# Altium footprint library Electronic Devices_LIB.PcbLib: 410 footprints (part 4 of 26)
Each footprint in its own frame and in the unit in brackets; x right, y up, seen from the top. Pads: shape width x height; smd on the part's side, far side on the other; paste and mask are expansions set on the pad; w line width, h text height; cw(c..) or ccw(c..) is an arc to the next point about the centre after c.
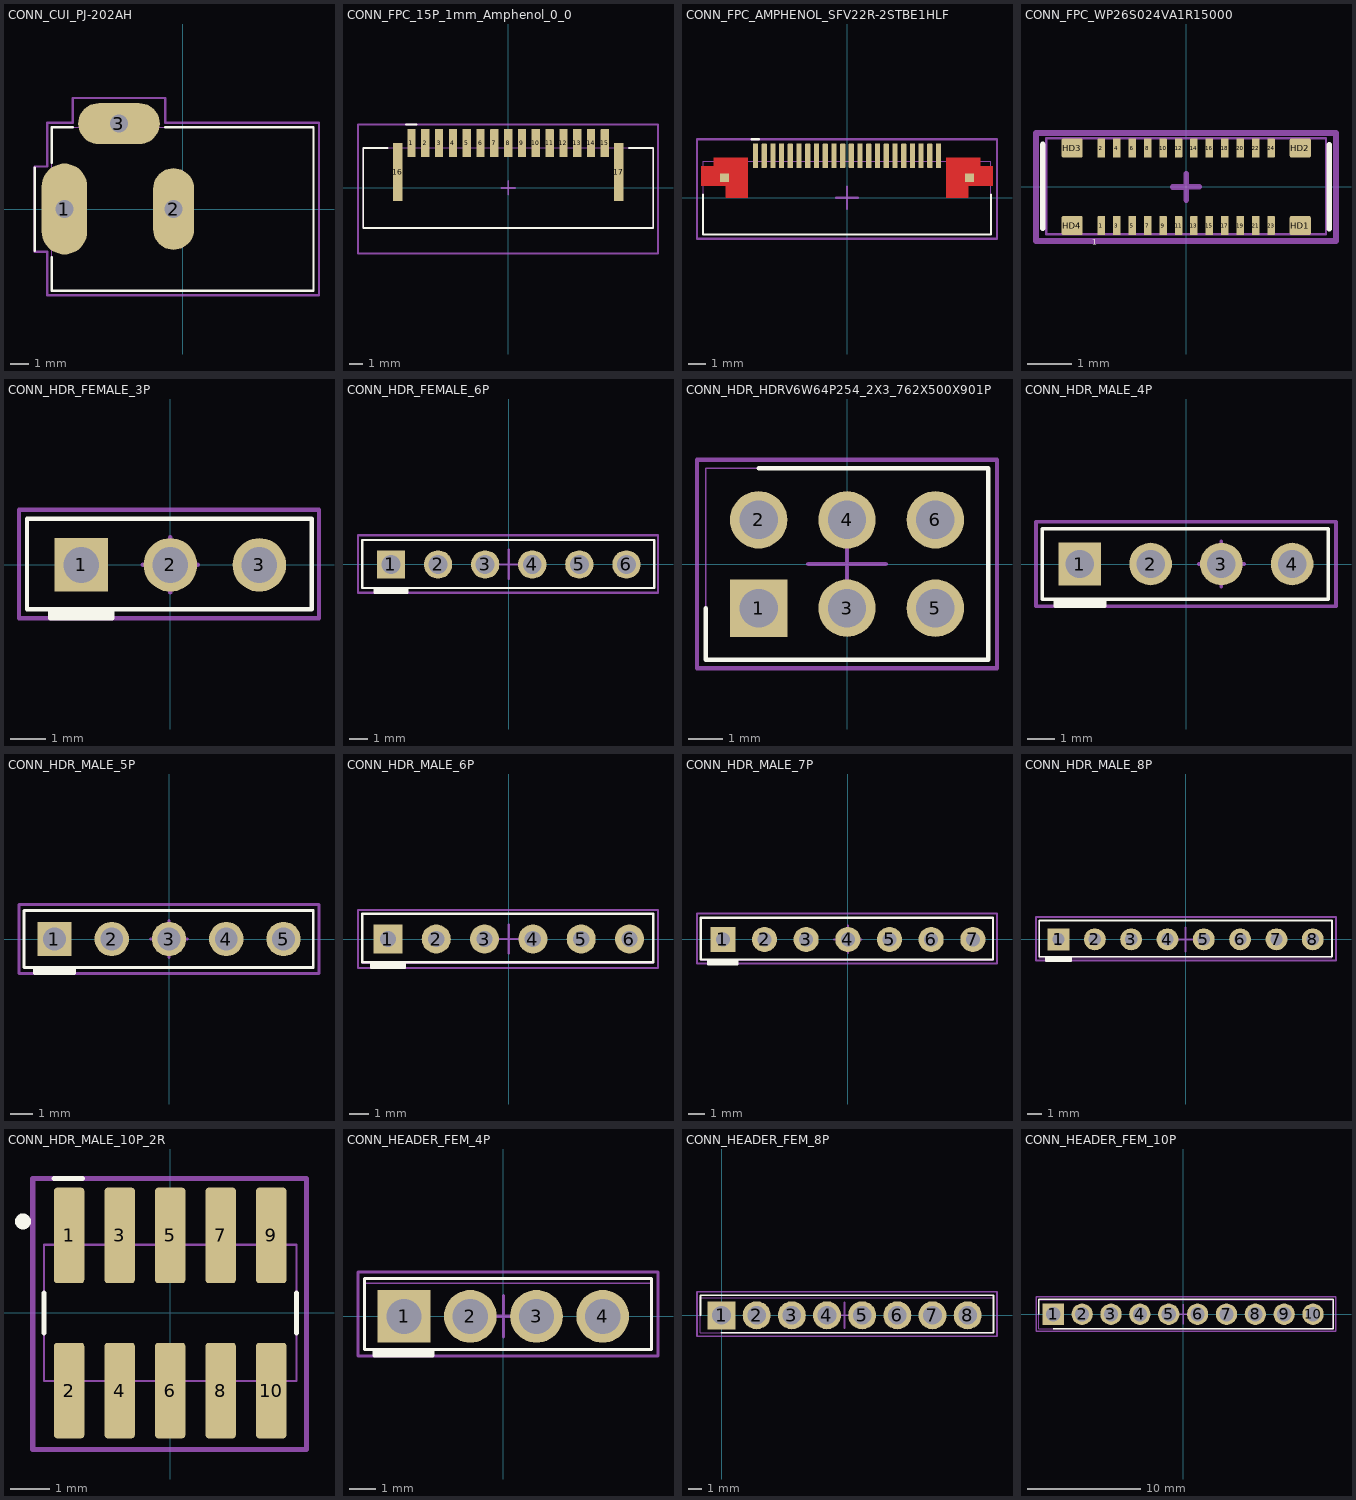
[diagram p3: the footprints below, top view; thin cyan lines are the x and y axes]

## CONN_CUI_PJ-202AH [mm] "Through Hole, Right Angle"
height 11
pads (3):
  oval 2.5x5 hole 1 square: 1(-6.5,0)
  oval 2.25x4.5 hole 1 square: 2(-0.5,0)
  oval 4.5x2.25 hole 1 square: 3(-3.5,4.7)
Top Overlay:
  lines w0.127: -8.128,-2.311 -8.128,2.261 ; -7.2,-2.65 -7.2,-4.5 7.2,-4.5 7.2,4.5 -0.95,4.5 ; -7.2,2.55 -7.2,4.5 -6.05,4.5
Top Assembly:
  lines w0.051: -7.2,-4.5 -7.2,4.5 7.2,4.5 7.2,-4.5 -7.2,-4.5
  text ".Designator" at -2.591,-0.085 h0.51
Top Courtyard:
  lines w0.127: -8.128,-2.35 -8.128,2.337 -7.45,2.337 -7.45,4.75 -6.05,4.75 -6.05,6.1 -0.95,6.1 -0.95,4.75 7.5,4.75 7.5,-4.75 -7.45,-4.75 -7.45,-2.35 -8.128,-2.35
3D body "CUI_DEVICES_PJ-202AH.step": height 11.01, standoff -3.49, extent -7.112,-4.522 7.288,4.878

## CONN_FPC_15P_1mm_Amphenol_0_0 [mm]
pads (17):
  rrect2% 0.6x2 smd: 1(-7,3.25) 2(-6,3.25) 3(-5,3.25) 4(-4,3.25) 5(-3,3.25) 6(-2,3.25) 7(-1,3.25) 8(0,3.25) 9(1,3.25) 10(2,3.25) 11(3,3.25) 12(4,3.25) 13(5,3.25) 14(6,3.25) 15(7,3.25)
  rrect2% 0.7x4.2 smd: 16(-8,1.15) 17(8,1.15)
Top Overlay:
  lines w0.127: -8.725,2.9 -10.5,2.9 -10.5,-2.9 10.5,-2.9 10.5,2.9 8.725,2.9 ; -7.391,4.597 -6.629,4.597
Top Assembly:
  lines w0.051: -10.5,-2.9 10.5,-2.9 10.5,2.9 -10.5,2.9 -10.5,-2.9
  text ".Designator" at -1.803,-0.085 h0.51
Top Courtyard:
  lines w0.127: -0.5,0 0.5,0 ; 0,-0.5 0,0.5 ; -10.871,-4.75 10.846,-4.75 10.846,4.597 -10.871,4.597 -10.871,-4.75
3D body "Conn_Amphenol_SFW15R-2STE1LF_eec.STEP": height 0.25, standoff 0, extent -10.6,-4.5 10.6,4.35

## CONN_FPC_AMPHENOL_SFV22R-2STBE1HLF [mm] "Pitch 0.5mm"
height 2
pads (24):
  rrect20% 0.3x1.4 smd mask+0.05: 1(-5.25,2.4) 2(-4.75,2.4) 3(-4.25,2.4) 4(-3.75,2.4) 5(-3.25,2.4) 6(-2.75,2.4) 7(-2.25,2.4) 8(-1.75,2.4) 9(-1.25,2.4) 10(-0.75,2.4) 11(-0.25,2.4) 12(0.25,2.4) 13(0.75,2.4) 14(1.25,2.4) 15(1.75,2.4) 16(2.25,2.4) 17(2.75,2.4) 18(3.25,2.4) 19(3.75,2.4) 20(4.25,2.4) 21(4.75,2.4) 22(5.25,2.4)
  rect 0.5x0.5 smd paste-1 mask+0: SH1(-7.025,1.15) SH2(7.025,1.15)
Top Layer:
  region: 7.65,1.8 8.35,1.8 8.35,0.7 6.95,0.7 6.95,0 5.7,0 5.7,2.3 7.65,2.3
  region: -5.7,0 -6.95,0 -6.95,0.7 -8.35,0.7 -8.35,1.8 -7.65,1.8 -7.65,2.3 -5.7,2.3
Top Overlay:
  lines w0.127: -8.25,0.18 -8.25,-2.1 8.25,-2.1 8.25,0.18 ; -5.461,3.353 -5.055,3.353
Top Paste:
  region: -5.7,0 -6.95,0 -6.95,0.7 -8.35,0.7 -8.35,1.8 -7.65,1.8 -7.65,2.3 -5.7,2.3
  region: 7.65,1.8 8.35,1.8 8.35,0.7 6.95,0.7 6.95,0 5.7,0 5.7,2.3 7.65,2.3
Top Solder:
  region: 7.75,1.9 8.45,1.9 8.45,0.6 7.05,0.6 7.05,-0.1 5.6,-0.1 5.6,2.4 7.75,2.4
  region: -5.6,-0.1 -7.05,-0.1 -7.05,0.6 -8.45,0.6 -8.45,1.9 -7.75,1.9 -7.75,2.4 -5.6,2.4
Top Assembly:
  lines w0.051: -8.25,-2.1 8.25,-2.1 8.25,2.1 -8.25,2.1 -8.25,-2.1
  text ".Designator" at -2.489,0.118 h0.51
Top Courtyard:
  lines w0.127: -0.635,0 0,0 ; 0,-0.635 0,0 ; 0,0.635 0,0 ; 0.635,0 0,0 ; -8.6,-2.35 8.6,-2.35 8.6,3.35 -8.6,3.35 -8.6,-2.35
3D body "SFV22R-2STBE1HLF--3DModel-STEP-56544.STEP": height 1.88, standoff 0.01, extent -8.25,-2.1 8.25,2.8

## CONN_FPC_WP26S024VA1R15000 [mm] "0.014\" (0.35mm) PITCH"
height 0.59
pads (28):
  rrect20% 0.17x0.44 smd mask+0.076: 1(-1.925,-0.88) 2(-1.925,0.88) 3(-1.575,-0.88) 4(-1.575,0.88) 5(-1.225,-0.88) 6(-1.225,0.88) 7(-0.875,-0.88) 8(-0.875,0.88) 9(-0.525,-0.88) 10(-0.525,0.88) 11(-0.175,-0.88) 12(-0.175,0.88) 13(0.175,-0.88) 14(0.175,0.88) 15(0.525,-0.88) 16(0.525,0.88) 17(0.875,-0.88) 18(0.875,0.88) 19(1.225,-0.88) 20(1.225,0.88) 21(1.575,-0.88) 22(1.575,0.88) 23(1.925,-0.88) 24(1.925,0.88)
  rrect20% 0.48x0.44 smd mask+0.076: HD1(2.59,-0.88) HD2(2.59,0.88) HD3(-2.59,0.88) HD4(-2.59,-0.88)
Top Overlay:
  lines w0.127: -3.26,-0.94 -3.26,0.96 ; 3.25,-0.95 3.25,0.95
  text "1" at -2.134,-1.321 h0.13
Top Assembly:
  lines w0.051: -3.175,-1.08 -3.175,1.1 3.175,1.1 3.175,-1.08 -3.175,-1.08
  text ".Designator" at -2.794,-0.136 h0.51
Top Courtyard:
  lines w0.127: -0.302,-0.004 -0.002,-0.004 ; 0,-0.3 0,0 ; 0,0.3 0,0 ; 0.3,0 0,0 ; -3.41,-1.23 3.4,-1.23 3.4,1.22 -3.41,1.22 -3.41,-1.23
3D body "WP26-S024VA1-R15000.stp": height 0.8, standoff 0, extent -3.175,-1.083 3.175,1.083

## CONN_HDR_FEMALE_3P [mm] "2.54mm Pitch,tht"
height 11.54
pads (3):
  rect 1.53x1.53 hole 1.02: 1(-2.54,0)
  round 1.53 hole 1.02: 2(0,0) 3(2.54,0)
Top Overlay:
  rectangle: -3.429,-1.522 -1.651,-1.27
  lines w0.127: -3.429,-1.524 -1.651,-1.524 -1.651,-1.27 ; -3.429,-1.522 -3.429,-1.27 ; -4.089,-1.27 4.039,-1.27 4.039,1.321 -4.089,1.321 -4.089,-1.27
Top Assembly:
  lines w0.051: -4.089,-1.27 -4.089,1.321 4.064,1.321 4.064,-1.27 -4.089,-1.27
  text ".Designator" at -2.591,-0.186 h0.51
Top Courtyard:
  lines w0.127: -0.787,0 0,0 ; 0,-0.787 0,0 ; 0,0.787 0,0 ; 0.787,0 0,0 ; -4.318,-1.524 4.242,-1.524 4.242,1.575 -4.318,1.575 -4.318,-1.524

## CONN_HDR_FEMALE_6P [mm] "2.54mm Pitch,tht"
height 11.54
pads (6):
  rect 1.53x1.53 hole 1.02: 1(-6.35,0)
  round 1.53 hole 1.02: 2(-3.81,0) 3(-1.27,0) 4(1.27,0) 5(3.81,0) 6(6.35,0)
Top Overlay:
  rectangle: -7.239,-1.522 -5.461,-1.27
  lines w0.127: -7.239,-1.524 -5.461,-1.524 -5.461,-1.27 ; -7.239,-1.522 -7.239,-1.27 ; -7.899,-1.27 7.849,-1.27 7.849,1.321 -7.899,1.321 -7.899,-1.27
Top Assembly:
  lines w0.051: -7.899,-1.27 -7.899,1.321 7.823,1.321 7.823,-1.27 -7.899,-1.27
  text ".Designator" at -2.591,-0.11 h0.51
Top Courtyard:
  lines w0.127: -0.787,0 0,0 ; 0,-0.787 0,0 ; 0,0.787 0,0 ; 0.787,0 0,0 ; -8.128,-1.524 8.052,-1.524 8.052,1.575 -8.128,1.575 -8.128,-1.524
3D body "PPTC061LFBN-RC--3DModel-STEP-56544.STEP": height 8.52, standoff -3.19, extent -7.874,-1.27 7.874,1.27

## CONN_HDR_HDRV6W64P254_2X3_762X500X901P [mm] "Pitch 2.54mm"
height 11.5
pads (6):
  rect 1.65x1.65 hole 1.1: 1(-2.54,-1.27)
  round 1.65 hole 1.1: 2(-2.54,1.27) 3(0,-1.27) 4(0,1.27) 5(2.54,-1.27) 6(2.54,1.27)
Top Overlay:
  lines w0.127: -4.064,-1.27 -4.064,-2.754 4.064,-2.754 4.064,2.754 -2.54,2.754
Top Assembly:
  lines w0.051: -4.064,-2.754 -4.064,2.754 4.064,2.754 4.064,-2.754 -4.064,-2.754
  text ".Designator" at -2.667,-0.186 h0.51
Top Courtyard:
  lines w0.127: -1.118,0 0,0 ; 0,-1.118 0,0 ; 0,1.118 0,0 ; 1.118,0 0,0 ; -4.314,-3.004 4.314,-3.004 4.314,3.004 -4.314,3.004 -4.314,-3.004
3D body "PH2-06-UA.stp": height 9.01, standoff -3.56, extent -3.81,-2.5 3.81,2.5

## CONN_HDR_MALE_4P [mm] "2.54mm Pitch,tht"
height 11.54
pads (4):
  rect 1.53x1.53 hole 1.02: 1(-3.81,0)
  round 1.53 hole 1.02: 2(-1.27,0) 3(1.27,0) 4(3.81,0)
Top Overlay:
  rectangle: -4.699,-1.522 -2.921,-1.27
  lines w0.127: -4.699,-1.524 -2.921,-1.524 -2.921,-1.27 ; -4.699,-1.522 -4.699,-1.27 ; -5.156,-1.27 5.105,-1.27 5.105,1.27 -5.156,1.27 -5.156,-1.27
Top Assembly:
  lines w0.051: -5.156,-1.27 -5.156,1.27 5.105,1.27 5.105,-1.27 -5.156,-1.27
  text ".Designator" at -1.473,-0.186 h0.51
Top Courtyard:
  lines w0.127: 0.457,0 1.27,0 ; 1.27,-0.813 1.27,0 ; 1.27,0.813 1.27,0 ; 2.083,0 1.27,0 ; -5.385,-1.524 5.385,-1.524 5.385,1.524 -5.385,1.524 -5.385,-1.524
3D body "68001-x04.stp": height 8.43, standoff -3, extent -5.08,-1.219 5.08,1.194

## CONN_HDR_MALE_5P [mm] "2.54mm Pitch,tht"
height 11.54
pads (5):
  rect 1.53x1.53 hole 1.02: 1(-5.08,0)
  round 1.53 hole 1.02: 2(-2.54,0) 3(0,0) 4(2.54,0) 5(5.08,0)
Top Overlay:
  rectangle: -5.969,-1.522 -4.191,-1.27
  lines w0.127: -5.969,-1.524 -4.191,-1.524 -4.191,-1.27 ; -5.969,-1.522 -5.969,-1.27 ; -6.426,-1.27 6.401,-1.27 6.401,1.27 -6.426,1.27 -6.426,-1.27
Top Assembly:
  lines w0.051: -6.426,-1.27 -6.426,1.27 6.401,1.27 6.401,-1.27 -6.426,-1.27
  text ".Designator" at -2.743,-0.186 h0.51
Top Courtyard:
  lines w0.127: -0.813,0 0,0 ; 0,-0.813 0,0 ; 0,0.813 0,0 ; 0.813,0 0,0 ; -6.655,-1.524 6.655,-1.524 6.655,1.524 -6.655,1.524 -6.655,-1.524
3D body "PH1-05-UA.stp": height 8.5, standoff -3.05, extent -6.35,-1.23 6.35,1.27

## CONN_HDR_MALE_6P [mm] "2.54mm Pitch,tht"
height 11.54
pads (6):
  rect 1.53x1.53 hole 0.86 square: 1(-6.35,0)
  round 1.53 hole 0.86 square: 2(-3.81,0) 3(-1.27,0) 4(1.27,0) 5(3.81,0) 6(6.35,0)
Top Overlay:
  rectangle: -7.239,-1.522 -5.461,-1.27
  lines w0.127: -7.239,-1.524 -5.461,-1.524 -5.461,-1.27 ; -7.239,-1.522 -7.239,-1.27 ; -7.696,-1.219 -7.696,1.321 7.595,1.321 7.595,-1.219 -7.696,-1.219
Top Assembly:
  lines w0.051: -7.696,-1.27 7.595,-1.27 7.595,1.321 -7.696,1.321 -7.696,-1.27
  text ".Designator" at -2.87,-0.212 h0.51
Top Courtyard:
  lines w0.127: -0.762,0 0,0 ; 0,-0.762 0,0 ; 0,0.762 0,0 ; 0.762,0 0,0 ; -7.925,-1.524 -7.925,1.524 7.849,1.524 7.849,-1.524 -7.925,-1.524

## CONN_HDR_MALE_7P [mm] "2.54mm Pitch,tht"
height 11.54
pads (7):
  rect 1.53x1.53 hole 0.86 square: 1(-7.62,0)
  round 1.53 hole 0.86 square: 2(-5.08,0) 3(-2.54,0) 4(0,0) 5(2.54,0) 6(5.08,0) 7(7.62,0)
Top Overlay:
  rectangle: -8.509,-1.522 -6.731,-1.27
  lines w0.127: -8.509,-1.524 -6.731,-1.524 -6.731,-1.27 ; -8.509,-1.522 -8.509,-1.27 ; -8.966,-1.219 -8.966,1.321 8.839,1.321 8.839,-1.219 -8.966,-1.219
Top Assembly:
  lines w0.051: -8.966,-1.27 8.865,-1.27 8.865,1.321 -8.966,1.321 -8.966,-1.27
  text ".Designator" at -2.565,-0.11 h0.51
Top Courtyard:
  lines w0.127: -0.838,0 0,0 ; 0,-0.838 0,0 ; 0,0.838 0,0 ; 0.838,0 0,0 ; -9.195,-1.473 -9.195,1.575 9.093,1.575 9.093,-1.473 -9.195,-1.473

## CONN_HDR_MALE_8P [mm] "2.54mm Pitch,tht"
height 11.54
pads (8):
  rect 1.53x1.53 hole 0.86: 1(-8.89,0)
  round 1.53 hole 0.86: 2(-6.35,0) 3(-3.81,0) 4(-1.27,0) 5(1.27,0) 6(3.81,0) 7(6.35,0) 8(8.89,0)
Top Overlay:
  rectangle: -9.779,-1.522 -8.001,-1.27
  lines w0.127: -9.779,-1.524 -8.001,-1.524 -8.001,-1.27 ; -9.779,-1.522 -9.779,-1.27 ; -10.236,-1.219 -10.236,1.321 10.23,1.321 10.23,-1.219 -10.236,-1.219
Top Assembly:
  lines w0.051: -10.236,-1.27 10.23,-1.27 10.23,1.321 -10.236,1.321 -10.236,-1.27
  text ".Designator" at -3.835,-0.11 h0.51
Top Courtyard:
  lines w0.127: -0.838,0 0,0 ; 0,-0.838 0,0 ; 0,0.838 0,0 ; 0.838,0 0,0 ; -10.465,-1.473 -10.465,1.575 10.516,1.575 10.516,-1.473 -10.465,-1.473
3D body "PH1-08-UA.STEP": height 8.51, standoff -3.04, extent -10.164,-1.194 10.164,1.306

## CONN_HDR_MALE_10P_2R [mm] "Pitch    0.050\" (1.27mm)"
height 3.05
pads (10):
  rrect20% 0.76x2.4 smd: 1(-2.54,1.95) 2(-2.54,-1.95) 3(-1.27,1.95) 4(-1.27,-1.95) 5(0,1.95) 6(0,-1.95) 7(1.27,1.95) 8(1.27,-1.95) 9(2.54,1.95) 10(2.54,-1.95)
Top Overlay:
  lines w0.127: -3.175,-0.5 -3.175,0.5 ; -2.921,3.378 -2.21,3.378 ; 3.175,-0.5 3.175,0.5
  lines w0.2: -3.7,2.2 cw(c-3.7,2.3) -3.7,2.4 cw(c-3.7,2.3) -3.7,2.2
Top Assembly:
  lines w0.051: -3.175,-1.715 3.175,-1.715 3.175,1.715 -3.175,1.715 -3.175,-1.715
  text ".Designator" at -2.819,-0.085 h0.51
Top Courtyard:
  lines w0.127: -3.454,-3.429 3.429,-3.429 3.429,3.378 -3.454,3.378 -3.454,-3.429
3D body "20021121-00010C4LF.stp": height 4.5, standoff 0, extent -3.155,-2.81 3.195,2.69

## CONN_HEADER_FEM_4P [mm] "2.54mm"
height 8.5
pads (4):
  rect 2.025x2.025 hole 1.35: 1(-3.81,0)
  round 2.025 hole 1.35: 2(-1.27,0) 3(1.27,0) 4(3.81,0)
Top Overlay:
  rectangle: -4.928,-1.499 -2.718,-1.27
  lines w0.127: -4.953,-1.524 -4.953,-1.27 ; -4.928,-1.524 -2.718,-1.524 -2.718,-1.295 -2.743,-1.27 ; -5.33,-1.27 -5.33,1.455 5.68,1.455 5.68,-1.27 -5.33,-1.27
Top Assembly:
  lines w0.051: -5.33,-1.27 -5.33,1.27 5.68,1.27 5.68,-1.27 -5.33,-1.27
  text ".Designator" at -1.676,0.068 h0.51
Top Courtyard:
  lines w0.127: -0.762,0 0,0 ; 0,-0.787 0,0 ; 0,0.787 0,0 ; 0.787,0 0,0 ; -5.58,-1.52 -5.58,1.705 5.93,1.705 5.93,-1.52 -5.58,-1.52
3D body "PPTC041LFBN-RC.stp": height 8.5, standoff -3.5, extent -5.33,-1.27 5.33,1.27

## CONN_HEADER_FEM_8P [mm] "0.100\" (2.54mm)"
height 11.7
pads (8):
  rect 2.025x2.025 hole 1.35: 1(0,0)
  round 2.025 hole 1.35: 2(2.54,0) 3(5.08,0) 4(7.62,0) 5(10.16,0) 6(12.7,0) 7(15.24,0) 8(17.78,0)
Top Overlay:
  lines w0.127: -1.52,0 -1.52,1.455 19.65,1.455 19.65,-1.27 0,-1.27
Top Assembly:
  lines w0.051: -1.52,-1.27 19.65,-1.27 19.65,1.27 -1.52,1.27 -1.52,-1.27
  text ".Designator" at 6.985,-0.11 h0.51
Top Courtyard:
  lines w0.127: 7.95,0 8.89,0 ; 8.89,-0.94 8.89,0 ; 8.89,0.94 8.89,0 ; 9.83,0 8.89,0 ; -1.77,-1.52 -1.77,1.705 19.9,1.705 19.9,-1.52 -1.77,-1.52
3D body "PPTC081LFBN-RC.stp": height 8.5, standoff -3.5, extent -1.52,-1.27 19.3,1.27

## CONN_HEADER_FEM_10P [mm] "0.100\" (2.54mm)"
height 11.7
pads (10):
  rect 1.875x1.875 hole 1.25: 1(-11.43,0)
  round 1.875 hole 1.25: 2(-8.89,0) 3(-6.35,0) 4(-3.81,0) 5(-1.27,0) 6(1.27,0) 7(3.81,0) 8(6.35,0) 9(8.89,0) 10(11.43,0)
Top Overlay:
  lines w0.127: -12.7,0 -12.7,1.305 13.2,1.305 13.2,-1.27 -11.43,-1.27
Top Assembly:
  lines w0.051: -12.7,-1.27 13.2,-1.27 13.2,1.27 -12.7,1.27 -12.7,-1.27
  text ".Designator" at -2.515,-0.186 h0.51
Top Courtyard:
  lines w0.127: -0.889,0 0,0 ; 0,-0.889 0,0 ; 0,0.889 0,0 ; 0.889,0 0,0 ; -12.95,-1.52 -12.95,1.555 13.45,1.555 13.45,-1.52 -12.95,-1.52
3D body "PPPC101LFBN-RC.stp": height 8.5, standoff -3.2, extent -12.95,-1.27 12.95,1.27